# Altium schematic symbol library Regulator_Switching.SchLib: 1070 symbols (part 5 of 9)
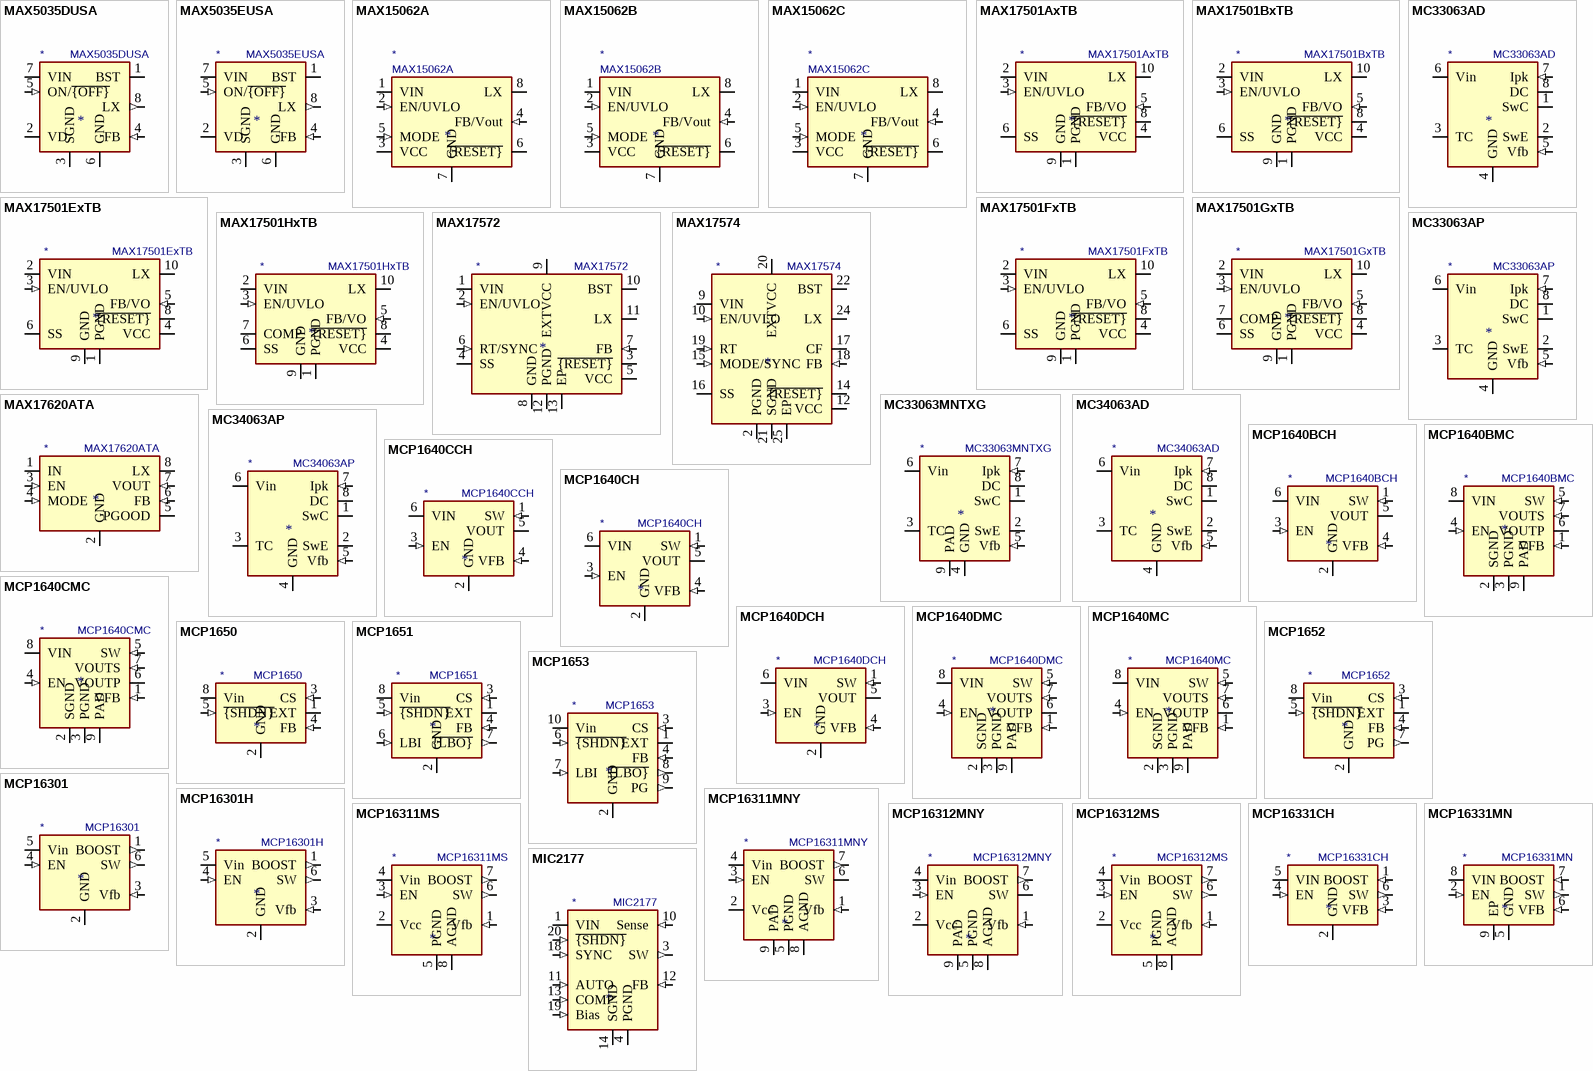
[diagram p30: symbols MAX5035DUSA to MIC2177]

## MAX17501ExTB
designator *  value MAX17501ExTB
ki_keywords: Step-down dc-dc switching regulator; ki_description: 4.5V–60Vin, 500mA, High-Efficiency, 3.3V Synchronous Step-Down DC-DC Converter, PWM Mode, DFN-10; ki_fp_filters: TDFN*1EP*2x3mm*P0.5mm*; Footprint: Package_DFN_QFN:TDFN-10-1EP_2x3mm_P0.5mm_EP0.9x2mm; Supplier: https://datasheets.maximintegrated.com/en/ds/MAX17501.pdf
footprint TDFN-10-1EP_2x3mm_P0.5mm_EP0.9x2mm
pins: 1 PGND (power), 2 VIN (power), 3 EN/UVLO (in), 4 VCC (power), 5 FB/VO (in), 6 SS, 7 NC (in) hidden, 8 ~{{RESET}} (oc), 9 GND (power), 10 LX (power), 11 GND hidden

## MAX17501FxTB
designator *  value MAX17501FxTB
ki_keywords: Step-down dc-dc switching regulator; ki_description: 4.5V–60Vin, 500mA, High-Efficiency, 5V Synchronous Step-Down DC-DC Converter, PWM Mode, DFN-10; ki_fp_filters: TDFN*1EP*2x3mm*P0.5mm*; Footprint: Package_DFN_QFN:TDFN-10-1EP_2x3mm_P0.5mm_EP0.9x2mm; Supplier: https://datasheets.maximintegrated.com/en/ds/MAX17501.pdf
footprint TDFN-10-1EP_2x3mm_P0.5mm_EP0.9x2mm
pins: 1 PGND (power), 2 VIN (power), 3 EN/UVLO (in), 4 VCC (power), 5 FB/VO (in), 6 SS, 7 NC (in) hidden, 8 ~{{RESET}} (oc), 9 GND (power), 10 LX (power), 11 GND hidden

## MAX17501GxTB
designator *  value MAX17501GxTB
ki_keywords: Step-down dc-dc switching regulator; ki_description: 4.5V–60Vin, 500mA, High-Efficiency, Adjustable Synchronous Step-Down DC-DC Converter, 600KHz, TDFN-10; ki_fp_filters: TDFN*1EP*2x3mm*P0.5mm*; Footprint: Package_DFN_QFN:TDFN-10-1EP_2x3mm_P0.5mm_EP0.9x2mm; Supplier: https://datasheets.maximintegrated.com/en/ds/MAX17501.pdf
footprint TDFN-10-1EP_2x3mm_P0.5mm_EP0.9x2mm
pins: 1 PGND (power), 2 VIN (power), 3 EN/UVLO (in), 4 VCC (power), 5 FB/VO (in), 6 SS, 7 COMP, 8 ~{{RESET}} (oc), 9 GND (power), 10 LX (power), 11 GND hidden

## MAX17501HxTB
designator *  value MAX17501HxTB
ki_keywords: Step-down dc-dc switching regulator; ki_description: 4.5V–60Vin, 500mA, High-Efficiency, Adjustable Synchronous Step-Down DC-DC Converter, 300KHz, DFN-10; ki_fp_filters: TDFN*1EP*2x3mm*P0.5mm*; Footprint: Package_DFN_QFN:TDFN-10-1EP_2x3mm_P0.5mm_EP0.9x2mm; Supplier: https://datasheets.maximintegrated.com/en/ds/MAX17501.pdf
footprint TDFN-10-1EP_2x3mm_P0.5mm_EP0.9x2mm
pins: 1 PGND (power), 2 VIN (power), 3 EN/UVLO (in), 4 VCC (power), 5 FB/VO (in), 6 SS, 7 COMP, 8 ~{{RESET}} (oc), 9 GND (power), 10 LX (power), 11 GND hidden

## MAX17572
designator *  value MAX17572
ki_keywords: Step-down dc-dc switching regulator; ki_description: 4.5V–60V, 1A, High-Efficiency, Synchronous Step-Down DC-DC Converter with Internal Compensation, DFN-12; ki_fp_filters: DFN*1EP*3x3mm*P0.5mm*; Footprint: Package_DFN_QFN:DFN-12-1EP_3x3mm_P0.5mm_EP2.05x2.86mm; Supplier: https://datasheets.maximintegrated.com/en/ds/MAX17572.pdf
footprint DFN-12-1EP_3x3mm_P0.5mm_EP2.05x2.86mm
pins: 1 VIN (power), 2 EN/UVLO (in), 3 ~{{RESET}} (oc), 4 SS, 5 VCC (power), 6 RT/SYNC (in), 7 FB (in), 8 GND (power), 9 EXTVCC (power), 10 BST, 11 LX (power), 12 PGND (power), 13 EP (power)

## MAX17574
designator *  value MAX17574
ki_keywords: Step-down dc-dc switching regulator; ki_description: 4.5V–60V, 3A, High-Efficiency, Synchronous Step-Down DC-DC Converter with Internal Compensation, QFN-24; ki_fp_filters: QFN*1EP*4x5mm*P0.5mm*; Footprint: Package_DFN_QFN:QFN-24-1EP_4x5mm_P0.5mm_EP2.65x3.65mm; Supplier: https://datasheets.maximintegrated.com/en/ds/MAX17574.pdf
footprint QFN-24-1EP_4x5mm_P0.5mm_EP2.65x3.65mm
pins: 1 LX hidden, 2 PGND (power), 3 PGND hidden, 4 NC (in) hidden, 5 VIN hidden, 6 VIN hidden, 7 VIN hidden, 8 NC (in) hidden, 9 VIN (power), 10 EN/UVLO (in), 11 PGND hidden, 12 VCC (power), 13 NC (in) hidden, 14 ~{{RESET}} (oc), 15 MODE/SYNC (in), 16 SS, 17 CF, 18 FB (in), 19 RT (in), 20 EXTVCC (power), 21 SGND (power), 22 BST, 23 LX hidden, 24 LX (power), 25 EP (power)

## MAX17620ATA
designator *  value MAX17620ATA
ki_keywords: switching-regulator; ki_description: 2.7-5.5V, 600mA, Synchronous Step-Down DC-DC Converter with Integrated MOSFETs, DFN-8; ki_fp_filters: TDFN*1EP*2x2mm*P0.5mm*; Footprint: Package_DFN_QFN:TDFN-8-1EP_2x2mm_P0.5mm_EP0.8x1.2mm; Supplier: https://datasheets.maximintegrated.com/en/ds/MAX17620.pdf
footprint TDFN-8-1EP_2x2mm_P0.5mm_EP0.8x1.2mm
pins: 1 IN (power), 2 GND (power), 3 EN (in), 4 MODE (in), 5 PGOOD (oc), 6 FB (in), 7 VOUT (in), 8 LX (power), 9 GND hidden

## MC33063AD
designator *  value MC33063AD
ki_keywords: smps buck boost inverting; ki_description: 1.5A, step-up/down/inverting switching regulator, 3-40V Vin, 100kHz, SO-8; ki_fp_filters: SOIC*3.9x4.9mm*P1.27mm*; Footprint: Package_SO:SOIC-8_3.9x4.9mm_P1.27mm; Supplier: http://www.onsemi.com/pub_link/Collateral/MC34063A-D.PDF
footprint SOIC-8_3.9x4.9mm_P1.27mm
pins: 1 SwC (oc), 2 SwE (oe), 3 TC, 4 GND (power), 5 Vfb (in), 6 Vin (power), 7 Ipk (in), 8 DC (oc)

## MC33063AP
designator *  value MC33063AP
ki_keywords: smps buck boost inverting; ki_description: 1.5A, step-up/down/inverting switching regulator, 3-40V Vin, 100kHz, DIP-8; ki_fp_filters: DIP*W7.62mm*; Footprint: Package_DIP:DIP-8_W7.62mm; Supplier: http://www.onsemi.com/pub_link/Collateral/MC34063A-D.PDF
footprint DIP-8_W7.62mm
pins: 1 SwC (oc), 2 SwE (oe), 3 TC, 4 GND (power), 5 Vfb (in), 6 Vin (power), 7 Ipk (in), 8 DC (oc)

## MC33063MNTXG
designator *  value MC33063MNTXG
ki_keywords: smps buck boost inverting; ki_description: 1.5A, step-up/down/inverting switching regulator, 3-40V Vin, 100kHz, DFN-8; ki_fp_filters: DFN*EP*4x4mm*P0.8mm*; Footprint: Package_DFN_QFN:DFN-8-1EP_4x4mm_P0.8mm_EP2.5x3.6mm; Supplier: http://www.onsemi.com/pub_link/Collateral/MC34063A-D.PDF
footprint DFN-8-1EP_4x4mm_P0.8mm_EP2.5x3.6mm
pins: 1 SwC (oc), 2 SwE (oe), 3 TC, 4 GND (power), 5 Vfb (in), 6 Vin (power), 7 Ipk (in), 8 DC (oc), 9 PAD

## MC34063AD
designator *  value MC34063AD
ki_keywords: smps buck boost inverting; ki_description: 1.5A, step-up/down/inverting switching regulator, 3-40V Vin, 100kHz, SO-8; ki_fp_filters: SOIC*3.9x4.9mm*P1.27mm*; Footprint: Package_SO:SOIC-8_3.9x4.9mm_P1.27mm; Supplier: http://www.onsemi.com/pub_link/Collateral/MC34063A-D.PDF
footprint SOIC-8_3.9x4.9mm_P1.27mm
pins: 1 SwC (oc), 2 SwE (oe), 3 TC, 4 GND (power), 5 Vfb (in), 6 Vin (power), 7 Ipk (in), 8 DC (oc)

## MC34063AP
designator *  value MC34063AP
ki_keywords: smps buck boost inverting; ki_description: 1.5A, step-up/down/inverting switching regulator, 3-40V Vin, 100kHz, DIP-8; ki_fp_filters: DIP*W7.62mm*; Footprint: Package_DIP:DIP-8_W7.62mm; Supplier: http://www.onsemi.com/pub_link/Collateral/MC34063A-D.PDF
footprint DIP-8_W7.62mm
pins: 1 SwC (oc), 2 SwE (oe), 3 TC, 4 GND (power), 5 Vfb (in), 6 Vin (power), 7 Ipk (in), 8 DC (oc)

## MCP1640BCH
designator *  value MCP1640BCH
ki_keywords: Step-Up Boost DC-DC Regulator Adjustable; ki_description: Synchronous Boost Regulator, Adjustable Output 2.0V-5.5V, PWM Only True Disconnect, SOT-23; ki_fp_filters: SOT?23*; Footprint: Package_TO_SOT_SMD:SOT-23-6; Supplier: http://ww1.microchip.com/downloads/en/DeviceDoc/20002234D.pdf
footprint SOT-23-6
pins: 1 SW (in), 2 GND (power), 3 EN (in), 4 VFB (in), 5 VOUT (power), 6 VIN (power)

## MCP1640BMC
designator *  value MCP1640BMC
ki_keywords: Step-Up Boost DC-DC Regulator Adjustable; ki_description: Synchronous Boost Regulator, Adjustable Output 2.0V-5.5V, PWM Only True Disconnect, DFN-8; ki_fp_filters: DFN*1EP*3x2mm*P0.5mm*; Footprint: Package_DFN_QFN:DFN-8-1EP_3x2mm_P0.5mm_EP1.75x1.45mm; Supplier: http://ww1.microchip.com/downloads/en/DeviceDoc/20002234D.pdf
footprint DFN-8-1EP_3x2mm_P0.5mm_EP1.75x1.45mm
pins: 1 VFB (in), 2 SGND (power), 3 PGND (power), 4 EN (in), 5 SW (in), 6 VOUTP (power), 7 VOUTS (in), 8 VIN (power), 9 PAD

## MCP1640CCH
designator *  value MCP1640CCH
ki_keywords: Step-Up Boost DC-DC Regulator Adjustable; ki_description: Synchronous Boost Regulator, Adjustable Output 2.0V-5.5V, PWM/PFM Input to Output Bypass, SOT-23; ki_fp_filters: SOT?23*; Footprint: Package_TO_SOT_SMD:SOT-23-6; Supplier: http://ww1.microchip.com/downloads/en/DeviceDoc/20002234D.pdf
footprint SOT-23-6
pins: 1 SW (in), 2 GND (power), 3 EN (in), 4 VFB (in), 5 VOUT (power), 6 VIN (power)

## MCP1640CH
designator *  value MCP1640CH
ki_keywords: Step-Up Boost DC-DC Regulator Adjustable; ki_description: Synchronous Boost Regulator, Adjustable Output 2.0V-5.5V, PWM/PFM True Disconnect, SOT-23; ki_fp_filters: SOT?23*; Footprint: Package_TO_SOT_SMD:SOT-23-6; Supplier: http://ww1.microchip.com/downloads/en/DeviceDoc/20002234D.pdf
footprint SOT-23-6
pins: 1 SW (in), 2 GND (power), 3 EN (in), 4 VFB (in), 5 VOUT (power), 6 VIN (power)

## MCP1640CMC
designator *  value MCP1640CMC
ki_keywords: Step-Up Boost DC-DC Regulator Adjustable; ki_description: Synchronous Boost Regulator, Adjustable Output 2.0V-5.5V, PWM/PFM Input to Output Bypass, DFN-8; ki_fp_filters: DFN*1EP*3x2mm*P0.5mm*; Footprint: Package_DFN_QFN:DFN-8-1EP_3x2mm_P0.5mm_EP1.75x1.45mm; Supplier: http://ww1.microchip.com/downloads/en/DeviceDoc/20002234D.pdf
footprint DFN-8-1EP_3x2mm_P0.5mm_EP1.75x1.45mm
pins: 1 VFB (in), 2 SGND (power), 3 PGND (power), 4 EN (in), 5 SW (in), 6 VOUTP (power), 7 VOUTS (in), 8 VIN (power), 9 PAD

## MCP1640DCH
designator *  value MCP1640DCH
ki_keywords: Step-Up Boost DC-DC Regulator Adjustable; ki_description: Synchronous Boost Regulator, Adjustable Output 2.0V-5.5V, PWM Only Input to Output Bypass, SOT-23; ki_fp_filters: SOT?23*; Footprint: Package_TO_SOT_SMD:SOT-23-6; Supplier: http://ww1.microchip.com/downloads/en/DeviceDoc/20002234D.pdf
footprint SOT-23-6
pins: 1 SW (in), 2 GND (power), 3 EN (in), 4 VFB (in), 5 VOUT (power), 6 VIN (power)

## MCP1640DMC
designator *  value MCP1640DMC
ki_keywords: Step-Up Boost DC-DC Regulator Adjustable; ki_description: Synchronous Boost Regulator, Adjustable Output 2.0V-5.5V, PWM Only Input to Output Bypass, DFN-8; ki_fp_filters: DFN*1EP*3x2mm*P0.5mm*; Footprint: Package_DFN_QFN:DFN-8-1EP_3x2mm_P0.5mm_EP1.75x1.45mm; Supplier: http://ww1.microchip.com/downloads/en/DeviceDoc/20002234D.pdf
footprint DFN-8-1EP_3x2mm_P0.5mm_EP1.75x1.45mm
pins: 1 VFB (in), 2 SGND (power), 3 PGND (power), 4 EN (in), 5 SW (in), 6 VOUTP (power), 7 VOUTS (in), 8 VIN (power), 9 PAD

## MCP1640MC
designator *  value MCP1640MC
ki_keywords: Step-Up Boost DC-DC Regulator Adjustable; ki_description: Synchronous Boost Regulator, Adjustable Output 2.0V-5.5V, PWM/PFM True Disconnect, DFN-8; ki_fp_filters: DFN*1EP*3x2mm*P0.5mm*; Footprint: Package_DFN_QFN:DFN-8-1EP_3x2mm_P0.5mm_EP1.75x1.45mm; Supplier: http://ww1.microchip.com/downloads/en/DeviceDoc/20002234D.pdf
footprint DFN-8-1EP_3x2mm_P0.5mm_EP1.75x1.45mm
pins: 1 VFB (in), 2 SGND (power), 3 PGND (power), 4 EN (in), 5 SW (in), 6 VOUTP (power), 7 VOUTS (in), 8 VIN (power), 9 PAD

## MCP1650
designator *  value MCP1650
ki_keywords: boost controller; ki_description: 750 kHz Boost Controller, 3.3-100V output voltage, 5W, MSOP-8; ki_fp_filters: MSOP*3x3mm*P0.65mm*; Footprint: Package_SO:MSOP-8_3x3mm_P0.65mm; Supplier: http://ww1.microchip.com/downloads/en/DeviceDoc/21876B.pdf
footprint MSOP-8_3x3mm_P0.65mm
pins: 1 EXT (oe), 2 GND (power), 3 CS (in), 4 FB (in), 5 ~{{SHDN}} (in), 6 NC (in) hidden, 7 NC (in) hidden, 8 Vin (power)

## MCP1651
designator *  value MCP1651
ki_keywords: boost controller; ki_description: 750 kHz Boost Controller, 3.3-100V output voltage, 5W, Low Battery Detection, MSOP-8; ki_fp_filters: MSOP*3x3mm*P0.65mm*; Footprint: Package_SO:MSOP-8_3x3mm_P0.65mm; Supplier: http://ww1.microchip.com/downloads/en/DeviceDoc/21876B.pdf
footprint MSOP-8_3x3mm_P0.65mm
pins: 1 EXT (oe), 2 GND (power), 3 CS (in), 4 FB (in), 5 ~{{SHDN}} (in), 6 LBI (in), 7 ~{{LBO}} (out), 8 Vin (power)

## MCP1652
designator *  value MCP1652
ki_keywords: boost controller; ki_description: 750 kHz Boost Controller, 3.3-100V output voltage, 5W, Power Good Detection, MSOP-8; ki_fp_filters: MSOP*3x3mm*P0.65mm*; Footprint: Package_SO:MSOP-8_3x3mm_P0.65mm; Supplier: http://ww1.microchip.com/downloads/en/DeviceDoc/21876B.pdf
footprint MSOP-8_3x3mm_P0.65mm
pins: 1 EXT (oe), 2 GND (power), 3 CS (in), 4 FB (in), 5 ~{{SHDN}} (in), 6 NC (in) hidden, 7 PG (out), 8 Vin (power)

## MCP1653
designator *  value MCP1653
ki_keywords: boost controller; ki_description: 750 kHz Boost Controller, 3.3-100V output voltage, 5W, Low Battery Detection, Power Good Detection, MSOP-10; ki_fp_filters: MSOP*3x3mm*P0.5mm*; Footprint: Package_SO:MSOP-10_3x3mm_P0.5mm; Supplier: http://ww1.microchip.com/downloads/en/DeviceDoc/21876B.pdf
footprint MSOP-10_3x3mm_P0.5mm
pins: 1 EXT (oe), 2 GND (power), 3 CS (in), 4 FB (in), 5 NC (in) hidden, 6 ~{{SHDN}} (in), 7 LBI (in), 8 ~{{LBO}} (out), 9 PG (out), 10 Vin (power)

## MCP16301
designator *  value MCP16301
ki_keywords: switching buck converter power-supply voltage regulator; ki_description: 1A, 4.0 to 30V Input, High Voltage Input integrated switch step-down regulator, SOT-23-6; ki_fp_filters: SOT?23*; Footprint: Package_TO_SOT_SMD:SOT-23-6; Supplier: http://ww1.microchip.com/downloads/en/DeviceDoc/20005004D.pdf
footprint SOT-23-6
pins: 1 BOOST (out), 2 GND (power), 3 Vfb (in), 4 EN (in), 5 Vin (power), 6 SW (out)

## MCP16301H
designator *  value MCP16301H
ki_keywords: switching buck converter power-supply voltage regulator; ki_description: 1A, 4.7 to 36V Input, High Voltage Input integrated switch step-down regulator, SOT-23-6; ki_fp_filters: SOT?23*; Footprint: Package_TO_SOT_SMD:SOT-23-6; Supplier: http://ww1.microchip.com/downloads/en/DeviceDoc/20005004D.pdf
footprint SOT-23-6
pins: 1 BOOST (out), 2 GND (power), 3 Vfb (in), 4 EN (in), 5 Vin (power), 6 SW (out)

## MCP16311MNY
designator *  value MCP16311MNY
ki_keywords: switching buck converter power-supply voltage regulator; ki_description: 1A Output Voltage, 30V Input, integrated switch step-down regulator, PFM/PWM modulation, DFN-8; ki_fp_filters: DFN*1EP*3x2mm*P0.5mm*; Footprint: Package_DFN_QFN:DFN-8-1EP_3x2mm_P0.5mm_EP1.75x1.45mm; Supplier: http://ww1.microchip.com/downloads/en/DeviceDoc/20005255B.pdf
footprint DFN-8-1EP_3x2mm_P0.5mm_EP1.75x1.45mm
pins: 1 Vfb (in), 2 Vcc (power), 3 EN (in), 4 Vin (power), 5 PGND (power), 6 SW (power), 7 BOOST (out), 8 AGND (power), 9 PAD (power)

## MCP16311MS
designator *  value MCP16311MS
ki_keywords: switching buck converter power-supply voltage regulator; ki_description: 30V Input, 1A Output Voltage, integrated switch step-down regulator, PFM/PWM modulation, MSOP-8; ki_fp_filters: MSOP*3x3mm*P0.65mm*; Footprint: Package_SO:MSOP-8_3x3mm_P0.65mm; Supplier: http://ww1.microchip.com/downloads/en/DeviceDoc/20005255B.pdf
footprint MSOP-8_3x3mm_P0.65mm
pins: 1 Vfb (in), 2 Vcc (power), 3 EN (in), 4 Vin (power), 5 PGND (power), 6 SW (out), 7 BOOST (out), 8 AGND (power)

## MCP16312MNY
designator *  value MCP16312MNY
ki_keywords: switching buck converter power-supply voltage regulator; ki_description: 1A Output Voltage, 30V Input, integrated switch step-down regulator, PWM modulation, DFN-8; ki_fp_filters: DFN*1EP*3x2mm*P0.5mm*; Footprint: Package_DFN_QFN:DFN-8-1EP_3x2mm_P0.5mm_EP1.75x1.45mm; Supplier: http://ww1.microchip.com/downloads/en/DeviceDoc/20005255B.pdf
footprint DFN-8-1EP_3x2mm_P0.5mm_EP1.75x1.45mm
pins: 1 Vfb (in), 2 Vcc (power), 3 EN (in), 4 Vin (power), 5 PGND (power), 6 SW (power), 7 BOOST (out), 8 AGND (power), 9 PAD (power)

## MCP16312MS
designator *  value MCP16312MS
ki_keywords: switching buck converter power-supply voltage regulator; ki_description: 1A Output Voltage, 30V Input, integrated switch step-down regulator with, modulation, MSOP-8; ki_fp_filters: MSOP*3x3mm*P0.65mm*; Footprint: Package_SO:MSOP-8_3x3mm_P0.65mm; Supplier: http://ww1.microchip.com/downloads/en/DeviceDoc/20005255B.pdf
footprint MSOP-8_3x3mm_P0.65mm
pins: 1 Vfb (in), 2 Vcc (power), 3 EN (in), 4 Vin (power), 5 PGND (power), 6 SW (out), 7 BOOST (out), 8 AGND (power)

## MCP16331CH
designator *  value MCP16331CH
ki_keywords: High-Voltage Input Integrated Switch Step-Down Regulator; ki_description: High-Voltage Input Integrated Switch Step-Down Regulator, VDD +4.4V to 50V, Out +2.0V to +24V, SOT-23; ki_fp_filters: SOT?23*; Footprint: Package_TO_SOT_SMD:SOT-23-6; Supplier: http://ww1.microchip.com/downloads/en/DeviceDoc/20005308C.pdf
footprint SOT-23-6
pins: 1 BOOST (in), 2 GND (power), 3 VFB (in), 4 EN (in), 5 VIN (power), 6 SW (out)

## MCP16331MN
designator *  value MCP16331MN
ki_keywords: High-Voltage Input Integrated Switch Step-Down Regulator; ki_description: High-Voltage Input Integrated Switch Step-Down Regulator, VDD +4.4V to 50V, Out +2.0V to +24V, TDFN-8; ki_fp_filters: DFN*1EP*3x2mm*P0.5mm*; Footprint: Package_DFN_QFN:DFN-8-1EP_3x2mm_P0.5mm_EP1.75x1.45mm; Supplier: http://ww1.microchip.com/downloads/en/DeviceDoc/20005308C.pdf
footprint DFN-8-1EP_3x2mm_P0.5mm_EP1.75x1.45mm
pins: 1 SW (out), 2 EN (in), 3 NC (in) hidden, 4 NC (in) hidden, 5 GND (power), 6 VFB (in), 7 BOOST (in), 8 VIN (power), 9 EP (power)

## MIC2177
designator *  value MIC2177
ki_keywords: Synchronous Buck Regulator adjustable; ki_description: 2.5A Synchronous Buck Regulator, Adjustable Output Voltage, SO-20W; ki_fp_filters: SOIC*W?7.5x12.8mm?P1.27mm*; Footprint: Package_SO:SOIC-20W_7.5x12.8mm_P1.27mm; Supplier: http://ww1.microchip.com/downloads/en/DeviceDoc/mic2177.pdf
footprint SOIC-20W_7.5x12.8mm_P1.27mm
pins: 1 VIN (power), 2 VIN hidden, 3 SW (out), 4 PGND (power), 5 PGND hidden, 6 PGND hidden, 7 PGND hidden, 8 SW hidden, 9 VIN hidden, 10 Sense (in), 11 AUTO (in), 12 FB (in), 13 COMP (in), 14 SGND (power), 15 SGND hidden, 16 SGND hidden, 17 SGND hidden, 18 SYNC (in), 19 Bias (in), 20 ~{{SHDN}} (in)

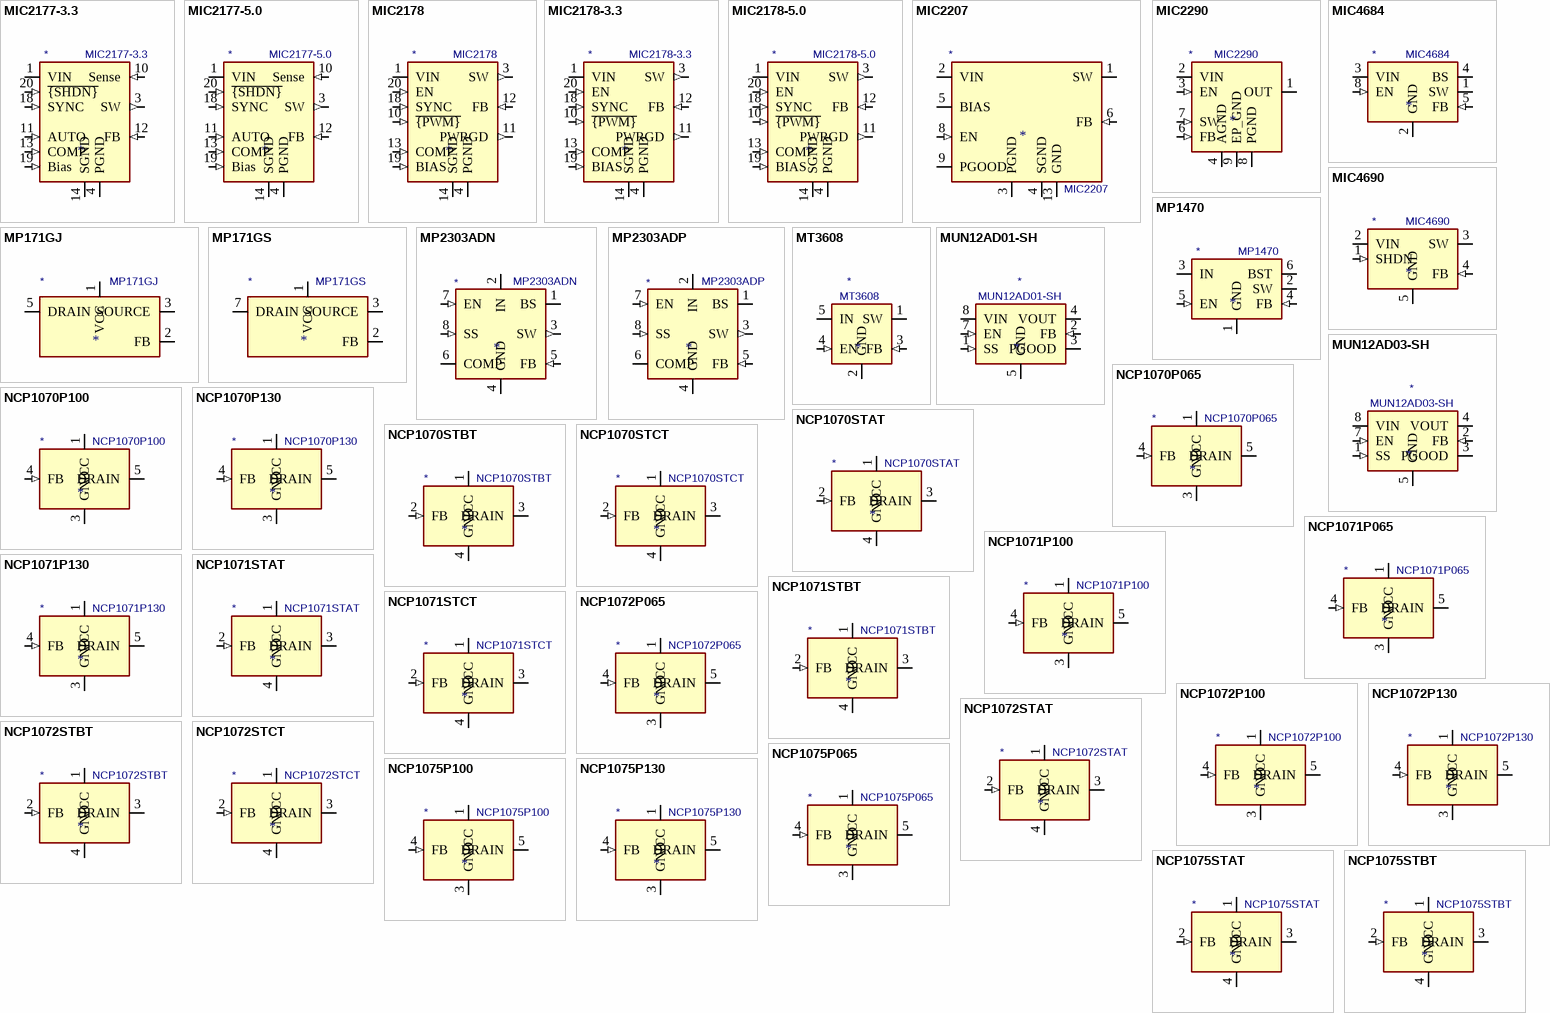
[diagram p14: symbols MIC2177-3.3 to NCP1075STBT]

## MIC2177-3.3
designator *  value MIC2177-3.3
ki_keywords: Synchronous Buck Regulator fixed; ki_description: 2.5A Synchronous Buck Regulator, 3.3V Fixed Output Voltage, SO-20W; ki_fp_filters: SOIC*W?7.5x12.8mm?P1.27mm*; Footprint: Package_SO:SOIC-20W_7.5x12.8mm_P1.27mm; Supplier: http://ww1.microchip.com/downloads/en/DeviceDoc/mic2177.pdf
footprint SOIC-20W_7.5x12.8mm_P1.27mm
pins: 1 VIN (power), 2 VIN hidden, 3 SW (out), 4 PGND (power), 5 PGND hidden, 6 PGND hidden, 7 PGND hidden, 8 SW hidden, 9 VIN hidden, 10 Sense (in), 11 AUTO (in), 12 FB (in), 13 COMP (in), 14 SGND (power), 15 SGND hidden, 16 SGND hidden, 17 SGND hidden, 18 SYNC (in), 19 Bias (in), 20 ~{{SHDN}} (in)

## MIC2177-5.0
designator *  value MIC2177-5.0
ki_keywords: Synchronous Buck Regulator fixed; ki_description: 2.5A Synchronous Buck Regulator, 5.0V Fixed Output Voltage, SO-20W; ki_fp_filters: SOIC*W?7.5x12.8mm?P1.27mm*; Footprint: Package_SO:SOIC-20W_7.5x12.8mm_P1.27mm; Supplier: http://ww1.microchip.com/downloads/en/DeviceDoc/mic2177.pdf
footprint SOIC-20W_7.5x12.8mm_P1.27mm
pins: 1 VIN (power), 2 VIN hidden, 3 SW (out), 4 PGND (power), 5 PGND hidden, 6 PGND hidden, 7 PGND hidden, 8 SW hidden, 9 VIN hidden, 10 Sense (in), 11 AUTO (in), 12 FB (in), 13 COMP (in), 14 SGND (power), 15 SGND hidden, 16 SGND hidden, 17 SGND hidden, 18 SYNC (in), 19 Bias (in), 20 ~{{SHDN}} (in)

## MIC2178
designator *  value MIC2178
ki_keywords: Synchronous Buck Regulator adjustable; ki_description: 2.5A Synchronous Buck Regulator, 4.5-16.5V Input Voltage, Adjustable Output Voltage, SO-20W; ki_fp_filters: SOIC*W*7.5x12.8mm*P1.27mm*; Footprint: Package_SO:SOIC-20W_7.5x12.8mm_P1.27mm; Supplier: http://ww1.microchip.com/downloads/en/DeviceDoc/mic2177.pdf
footprint SOIC-20W_7.5x12.8mm_P1.27mm
pins: 1 VIN (power), 2 VIN hidden, 3 SW (out), 4 PGND (power), 5 PGND hidden, 6 PGND hidden, 7 PGND hidden, 8 SW hidden, 9 VIN hidden, 10 ~{{PWM}} (in), 11 PWRGD (out), 12 FB (in), 13 COMP (in), 14 SGND (power), 15 SGND hidden, 16 SGND hidden, 17 SGND hidden, 18 SYNC (in), 19 BIAS (in), 20 EN (in)

## MIC2178-3.3
designator *  value MIC2178-3.3
ki_keywords: Synchronous Buck Regulator fixed; ki_description: 2.5A Synchronous Buck Regulator, 4.5-16.5V Input Voltage, 3.3V Fixed Output Voltage, SO-20W; ki_fp_filters: SOIC*W*7.5x12.8mm*P1.27mm*; Footprint: Package_SO:SOIC-20W_7.5x12.8mm_P1.27mm; Supplier: http://ww1.microchip.com/downloads/en/DeviceDoc/mic2177.pdf
footprint SOIC-20W_7.5x12.8mm_P1.27mm
pins: 1 VIN (power), 2 VIN hidden, 3 SW (out), 4 PGND (power), 5 PGND hidden, 6 PGND hidden, 7 PGND hidden, 8 SW hidden, 9 VIN hidden, 10 ~{{PWM}} (in), 11 PWRGD (out), 12 FB (in), 13 COMP (in), 14 SGND (power), 15 SGND hidden, 16 SGND hidden, 17 SGND hidden, 18 SYNC (in), 19 BIAS (in), 20 EN (in)

## MIC2178-5.0
designator *  value MIC2178-5.0
ki_keywords: Synchronous Buck Regulator fixed; ki_description: 2.5A Synchronous Buck Regulator, 4.5-16.5V Input Voltage, 5.0V Fixed Output Voltage, SO-20W; ki_fp_filters: SOIC*W*7.5x12.8mm*P1.27mm*; Footprint: Package_SO:SOIC-20W_7.5x12.8mm_P1.27mm; Supplier: http://ww1.microchip.com/downloads/en/DeviceDoc/mic2177.pdf
footprint SOIC-20W_7.5x12.8mm_P1.27mm
pins: 1 VIN (power), 2 VIN hidden, 3 SW (out), 4 PGND (power), 5 PGND hidden, 6 PGND hidden, 7 PGND hidden, 8 SW hidden, 9 VIN hidden, 10 ~{{PWM}} (in), 11 PWRGD (out), 12 FB (in), 13 COMP (in), 14 SGND (power), 15 SGND hidden, 16 SGND hidden, 17 SGND hidden, 18 SYNC (in), 19 BIAS (in), 20 EN (in)

## MIC2207
designator *  value MIC2207
ki_keywords: adjustable switching regulator; ki_description: 3A 2MHz Non-Synchronous Buck Regulator, DFN-12; ki_fp_filters: DFN*1EP*3x3mm*P0.5mm*; Footprint: Package_DFN_QFN:DFN-12-1EP_3x3mm_P0.5mm_EP1.7x2.4mm; Supplier: https://ww1.microchip.com/downloads/aemDocuments/documents/APID/ProductDocuments/DataSheets/MIC2207-2MHz-3A-PWM-Buck-Regulator-DS20006470A.pdf
footprint DFN-12-1EP_3x3mm_P0.5mm_EP1.7x2.4mm
pins: 1 SW (power), 2 VIN (power), 3 PGND (power), 4 SGND (power), 5 BIAS, 6 FB (in), 7 NC (in) hidden, 8 EN (in), 9 PGOOD (oc), 10 PGND hidden, 11 VIN hidden, 12 SW hidden, 13 GND (power)

## MIC2290
designator *  value MIC2290
ki_keywords: boost switching voltage converter regulator; ki_description: 1.2 Mhz PWM Boost Regulator with Internal Schotty Diode, MLF-8; ki_fp_filters: Micrel*MLF*8*2x2mm*; Footprint: Package_DFN_QFN:Micrel_MLF-8-1EP_2x2mm_P0.5mm_EP0.8x1.3mm_ThermalVias; Supplier: http://ww1.microchip.com/downloads/en/DeviceDoc/mic2290.pdf
footprint Micrel_MLF-8-1EP_2x2mm_P0.5mm_EP0.8x1.3mm_ThermalVias
pins: 1 OUT (power), 2 VIN (power), 3 EN (in), 4 AGND (power), 5 NC (in) hidden, 6 FB (in), 7 SW (in), 8 PGND (power), 9 EP_GND (power)

## MIC4684
designator *  value MIC4684
ki_keywords: regulator switching adjustable; ki_description: 2A, 200kHz SuperSwitcher Buck Regulator, 4-30V Input Voltage, Adjustable Output Voltage, SO-8; ki_fp_filters: SOIC*3.9x4.9mm*P1.27mm*; Footprint: Package_SO:SOIC-8_3.9x4.9mm_P1.27mm; Supplier: https://ww1.microchip.com/downloads/en/DeviceDoc/MIC4684.pdf
footprint SOIC-8_3.9x4.9mm_P1.27mm
pins: 1 SW (power), 2 GND (power), 3 VIN (power), 4 BS, 5 FB (in), 6 GND hidden, 7 GND hidden, 8 EN (in)

## MIC4690
designator *  value MIC4690
ki_keywords: regulator switching adjustable; ki_description: 1A, 500kHz SuperSwitcher Buck Regulator, 4-34V Input Voltage, Adjustable Output Voltage, SO-8; ki_fp_filters: SOIC*3.9x4.9mm*P1.27mm*; Footprint: Package_SO:SOIC-8_3.9x4.9mm_P1.27mm; Supplier: http://ww1.microchip.com/downloads/en/DeviceDoc/mic4690.pdf
footprint SOIC-8_3.9x4.9mm_P1.27mm
pins: 1 SHDN (in), 2 VIN (power), 3 SW (power), 4 FB (in), 5 GND (power), 6 GND hidden, 7 GND hidden, 8 GND hidden

## MP171GJ
designator *  value MP171GJ
ki_keywords: regulator switching adjustable; ki_description: 60mA Non-Isolated Off-Line Regulator, 700V Input Voltage, Adjustable Output Voltage, TSOT-23-5; ki_fp_filters: TSOT?23*; Footprint: Package_TO_SOT_SMD:TSOT-23-5; Supplier: https://www.monolithicpower.com/pub/media/document/m/p/mp171_r1.01.pdf
footprint TSOT-23-5
pins: 1 VCC (power), 2 FB, 3 SOURCE (power), 4 SOURCE hidden, 5 DRAIN (power)

## MP171GS
designator *  value MP171GS
ki_keywords: regulator switching adjustable; ki_description: 60mA Non-Isolated Off-Line Regulator, 700V Input Voltage, Adjustable Output Voltage, SOIC-8; ki_fp_filters: SOIC*3.9x4.9mm*P1.27mm*; Footprint: Package_SO:SOIC-8_3.9x4.9mm_P1.27mm; Supplier: https://www.monolithicpower.com/pub/media/document/m/p/mp171_r1.01.pdf
footprint SOIC-8_3.9x4.9mm_P1.27mm
pins: 1 VCC (power), 2 FB, 3 SOURCE (power), 4 SOURCE hidden, 5 NC (in) hidden, 6 NC (in) hidden, 7 DRAIN (power), 8 NC (in) hidden

## MP1470
designator *  value MP1470
ki_keywords: buck converter; ki_description: High-Efficiency, 2A, 16V, 500kHz Synchronous, Step-Down Converter, TSOT-23-6; ki_fp_filters: TSOT?23*; Footprint: Package_TO_SOT_SMD:TSOT-23-6; Supplier: https://www.monolithicpower.com/pub/media/document/MP1470_r1.02.pdf
footprint TSOT-23-6
pins: 1 GND (power), 2 SW (power), 3 IN (power), 4 FB (in), 5 EN (in), 6 BST

## MP2303ADN
designator *  value MP2303ADN
ki_keywords: buck converter step down; ki_description: Synchronous Rectified 3A, 28V, 360kHz Step-Down Converter, SOIC-8; ki_fp_filters: SOIC*1EP*3.9x4.9mm*P1.27mm*; Footprint: Package_SO:SOIC-8-1EP_3.9x4.9mm_P1.27mm_EP2.62x3.51mm; Supplier: https://www.monolithicpower.com/pub/media/document/MP2303A_r1.1.pdf
footprint SOIC-8-1EP_3.9x4.9mm_P1.27mm_EP2.62x3.51mm
pins: 1 BS, 2 IN (power), 3 SW (out), 4 GND (power), 5 FB (in), 6 COMP, 7 EN (in), 8 SS (in)

## MP2303ADP
designator *  value MP2303ADP
ki_keywords: buck converter step down; ki_description: Synchronous Rectified 3A, 28V, 360kHz Step-Down Converter, DIP-8; ki_fp_filters: DIP*W7.62mm*; Footprint: Package_DIP:DIP-8_W7.62mm; Supplier: https://www.monolithicpower.com/pub/media/document/MP2303A_r1.1.pdf
footprint DIP-8_W7.62mm
pins: 1 BS, 2 IN (power), 3 SW (out), 4 GND (power), 5 FB (in), 6 COMP, 7 EN (in), 8 SS (in)

## MT3608
designator *  value MT3608
ki_keywords: Step-Up Boost DC-DC Regulator Adjustable; ki_description: High Efficiency 1.2MHz 2A Step Up Converter, 2-24V Vin, 28V Vout, 4A current limit, 1.2MHz, SOT23-6; ki_fp_filters: SOT*23*; Footprint: Package_TO_SOT_SMD:SOT-23-6; Supplier: https://www.olimex.com/Products/Breadboarding/BB-PWR-3608/resources/MT3608.pdf
footprint SOT-23-6
pins: 1 SW, 2 GND (power), 3 FB (in), 4 EN (in), 5 IN (power), 6 NC (in) hidden

## MUN12AD01-SH
designator *  value MUN12AD01-SH
ki_keywords: DC/DC Switching Regulator Power Module 1A Cyntec MUN12AD01; ki_description: DC/DC Switching Regulator, Power Module, 1A, Cyntec MUN12AD01; ki_fp_filters: Converter?DCDC?Cyntec?MUN12AD01?SH*; Footprint: Converter_DCDC:Converter_DCDC_Cyntec_MUN12AD01-SH; Supplier: http://www.cyntec.com/upfile/products/download/Cyntec%20MUN12AD01-SH_Datasheet.pdf
footprint Converter_DCDC_Cyntec_MUN12AD01-SH
pins: 1 SS (in), 2 FB (in), 3 PGOOD (oc), 4 VOUT (power), 5 GND (power), 6 NC (in) hidden, 7 EN (in), 8 VIN (power), 9 GND hidden

## MUN12AD03-SH
designator *  value MUN12AD03-SH
ki_keywords: DC/DC Switching Regulator Power Module 3A Cyntec MUN12AD03; ki_description: DC/DC Switching Regulator, Power Module, 3A, Cyntec MUN12AD03; ki_fp_filters: Converter?DCDC?Cyntec?MUN12AD03?SH*; Footprint: Converter_DCDC:Converter_DCDC_Cyntec_MUN12AD03-SH; Supplier: http://www.cyntec.com/upfile/products/download/Cyntec%20MUN12AD03-SH_Datasheet.pdf
footprint Converter_DCDC_Cyntec_MUN12AD03-SH
pins: 1 SS (in), 2 FB (in), 3 PGOOD (oc), 4 VOUT (power), 5 GND (power), 6 NC (in) hidden, 7 EN (in), 8 VIN (power), 9 VOUT hidden, 10 GND hidden, 11 GND hidden

## NCP1070P065
designator *  value NCP1070P065
ki_keywords: SMPS Converter; ki_description: High-Voltage Switcher for Low Power Offline SMPS, 700V Vds, 14W/7.75W, 230V/85-265V, 65kHz, 22Ohm Rds(on), 250mA Ipk, DIP-7; ki_fp_filters: DIP*N7*W7.62mm*; Footprint: Package_DIP:DIP-8-N7_W7.62mm; Supplier: http://www.onsemi.com/pub/Collateral/NCP1070-D.PDF
footprint DIP-8-N7_W7.62mm
pins: 1 VCC (power), 2 NC (in) hidden, 3 GND (power), 4 FB (in), 5 DRAIN (oc), 7 GND hidden, 8 GND hidden

## NCP1070P100
designator *  value NCP1070P100
ki_keywords: SMPS Converter; ki_description: High-Voltage Switcher for Low Power Offline SMPS, 700V Vds, 14W/7.75W, 230V/85-265V, 100kHz, 22Ohm Rds(on), 250mA Ipk, DIP-7; ki_fp_filters: DIP*N7*W7.62mm*; Footprint: Package_DIP:DIP-8-N7_W7.62mm; Supplier: http://www.onsemi.com/pub/Collateral/NCP1070-D.PDF
footprint DIP-8-N7_W7.62mm
pins: 1 VCC (power), 2 NC (in) hidden, 3 GND (power), 4 FB (in), 5 DRAIN (oc), 7 GND hidden, 8 GND hidden

## NCP1070P130
designator *  value NCP1070P130
ki_keywords: SMPS Converter; ki_description: High-Voltage Switcher for Low Power Offline SMPS, 700V Vds, 14W/7.75W, 230V/85-265V, 130kHz, 22Ohm Rds(on), 250mA Ipk, DIP-7; ki_fp_filters: DIP*N7*W7.62mm*; Footprint: Package_DIP:DIP-8-N7_W7.62mm; Supplier: http://www.onsemi.com/pub/Collateral/NCP1070-D.PDF
footprint DIP-8-N7_W7.62mm
pins: 1 VCC (power), 2 NC (in) hidden, 3 GND (power), 4 FB (in), 5 DRAIN (oc), 7 GND hidden, 8 GND hidden

## NCP1070STAT
designator *  value NCP1070STAT
ki_keywords: SMPS Converter; ki_description: High-Voltage Switcher for Low Power Offline SMPS, 700V Vds, 14W/7.75W, 230V/85-265V, 65kHz, 22Ohm Rds(on), 250mA Ipk, SOT-223; ki_fp_filters: SOT?223*; Footprint: Package_TO_SOT_SMD:SOT-223; Supplier: http://www.onsemi.com/pub/Collateral/NCP1070-D.PDF
footprint SOT-223
pins: 1 VCC (power), 2 FB (in), 3 DRAIN (oc), 4 GND (power)

## NCP1070STBT
designator *  value NCP1070STBT
ki_keywords: SMPS Converter; ki_description: High-Voltage Switcher for Low Power Offline SMPS, 700V Vds, 14W/7.75W, 230V/85-265V, 100kHz, 22Ohm Rds(on), 250mA Ipk, SOT-223; ki_fp_filters: SOT?223*; Footprint: Package_TO_SOT_SMD:SOT-223; Supplier: http://www.onsemi.com/pub/Collateral/NCP1070-D.PDF
footprint SOT-223
pins: 1 VCC (power), 2 FB (in), 3 DRAIN (oc), 4 GND (power)

## NCP1070STCT
designator *  value NCP1070STCT
ki_keywords: SMPS Converter; ki_description: High-Voltage Switcher for Low Power Offline SMPS, 700V Vds, 14W/7.75W, 230V/85-265V, 130kHz, 22Ohm Rds(on), 250mA Ipk, SOT-223; ki_fp_filters: SOT?223*; Footprint: Package_TO_SOT_SMD:SOT-223; Supplier: http://www.onsemi.com/pub/Collateral/NCP1070-D.PDF
footprint SOT-223
pins: 1 VCC (power), 2 FB (in), 3 DRAIN (oc), 4 GND (power)

## NCP1071P065
designator *  value NCP1071P065
ki_keywords: SMPS Converter; ki_description: High-Voltage Switcher for Low Power Offline SMPS, 700V Vds, 14W/7.75W, 230V/85-265V, 65kHz, 22Ohm Rds(on), 350mA Ipk, DIP-7; ki_fp_filters: DIP*N7*W7.62mm*; Footprint: Package_DIP:DIP-8-N7_W7.62mm; Supplier: http://www.onsemi.com/pub/Collateral/NCP1070-D.PDF
footprint DIP-8-N7_W7.62mm
pins: 1 VCC (power), 2 NC (in) hidden, 3 GND (power), 4 FB (in), 5 DRAIN (oc), 7 GND hidden, 8 GND hidden

## NCP1071P100
designator *  value NCP1071P100
ki_keywords: SMPS Converter; ki_description: High-Voltage Switcher for Low Power Offline SMPS, 700V Vds, 14W/7.75W, 230V/85-265V, 100kHz, 22Ohm Rds(on), 350mA Ipk, DIP-7; ki_fp_filters: DIP*N7*W7.62mm*; Footprint: Package_DIP:DIP-8-N7_W7.62mm; Supplier: http://www.onsemi.com/pub/Collateral/NCP1070-D.PDF
footprint DIP-8-N7_W7.62mm
pins: 1 VCC (power), 2 NC (in) hidden, 3 GND (power), 4 FB (in), 5 DRAIN (oc), 7 GND hidden, 8 GND hidden

## NCP1071P130
designator *  value NCP1071P130
ki_keywords: SMPS Converter; ki_description: High-Voltage Switcher for Low Power Offline SMPS, 700V Vds, 14W/7.75W, 230V/85-265V, 130kHz, 22Ohm Rds(on), 350mA Ipk, DIP-7; ki_fp_filters: DIP*N7*W7.62mm*; Footprint: Package_DIP:DIP-8-N7_W7.62mm; Supplier: http://www.onsemi.com/pub/Collateral/NCP1070-D.PDF
footprint DIP-8-N7_W7.62mm
pins: 1 VCC (power), 2 NC (in) hidden, 3 GND (power), 4 FB (in), 5 DRAIN (oc), 7 GND hidden, 8 GND hidden

## NCP1071STAT
designator *  value NCP1071STAT
ki_keywords: SMPS Converter; ki_description: High-Voltage Switcher for Low Power Offline SMPS, 700V Vds, 14W/7.75W, 230V/85-265V, 65kHz, 22Ohm Rds(on), 350mA Ipk, SOT-223; ki_fp_filters: SOT?223*; Footprint: Package_TO_SOT_SMD:SOT-223; Supplier: http://www.onsemi.com/pub/Collateral/NCP1070-D.PDF
footprint SOT-223
pins: 1 VCC (power), 2 FB (in), 3 DRAIN (oc), 4 GND (power)

## NCP1071STBT
designator *  value NCP1071STBT
ki_keywords: SMPS Converter; ki_description: High-Voltage Switcher for Low Power Offline SMPS, 700V Vds, 14W/7.75W, 230V/85-265V, 100kHz, 22Ohm Rds(on), 350mA Ipk, SOT-223; ki_fp_filters: SOT?223*; Footprint: Package_TO_SOT_SMD:SOT-223; Supplier: http://www.onsemi.com/pub/Collateral/NCP1070-D.PDF
footprint SOT-223
pins: 1 VCC (power), 2 FB (in), 3 DRAIN (oc), 4 GND (power)
